# Altium schematic symbol library GN-1846-E-V2_Library.SchLib: 99 symbols (part 6 of 7)
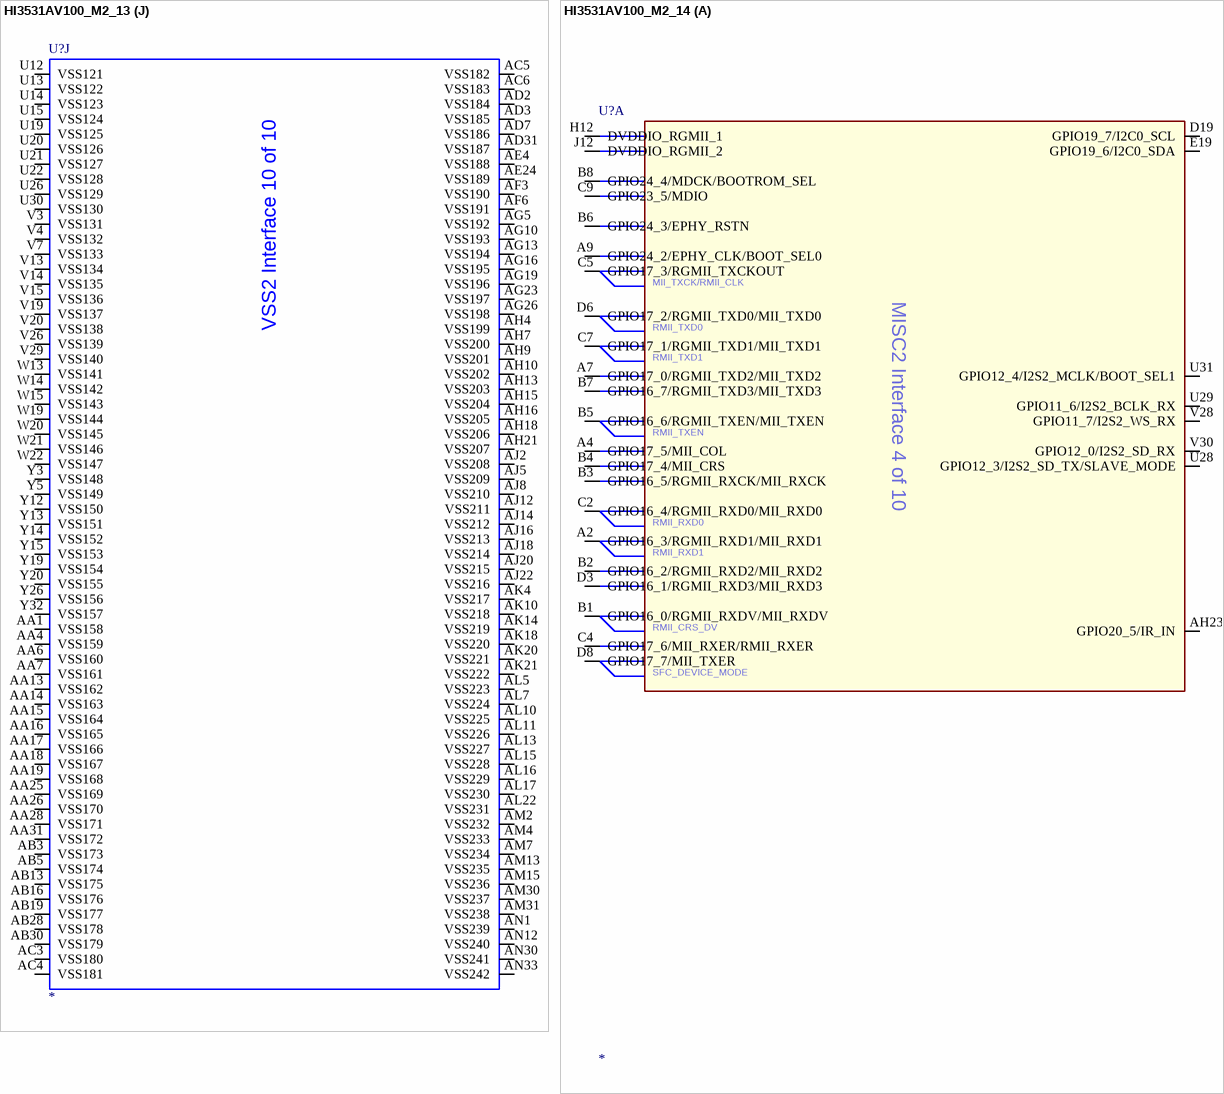
[diagram p82: symbols HI3531AV100_M2_13 to HI3531AV100_M2_14]

## HI3531AV100_M2_13
designator U?
FORWARD_PCB: 1; HETERO: (HI3531AV100_DDR1),(HI3531AV100_DDR2),(HI3531AV100_SYSTEM),(HI3531AV100_AD),(HI3531AV100_VO),(HI3531AV100_M1),(HI3531AV100_M2),(HI3531AV100_POWER),(HI3531AV100_VSS1),(HI3531AV100_VSS2); DEVICE: HI3531AV100; LEVEL: STD; OriginalSymbolOrigin: (30,630); PARTS: 1
part A pins: A2 GPIO16_3/RGMII_RXD1/MII_RXD1, A4 GPIO17_5/MII_COL, A7 GPIO17_0/RGMII_TXD2/MII_TXD2, A9 GPIO24_2/EPHY_CLK/BOOT_SEL0, AH23 GPIO20_5/IR_IN, B1 GPIO16_0/RGMII_RXDV/MII_RXDV, B2 GPIO16_2/RGMII_RXD2/MII_RXD2, B3 GPIO16_5/RGMII_RXCK/MII_RXCK, B4 GPIO17_4/MII_CRS, B5 GPIO16_6/RGMII_TXEN/MII_TXEN, B6 GPIO24_3/EPHY_RSTN, B7 GPIO16_7/RGMII_TXD3/MII_TXD3, B8 GPIO24_4/MDCK/BOOTROM_SEL, C2 GPIO16_4/RGMII_RXD0/MII_RXD0, C4 GPIO17_6/MII_RXER/RMII_RXER, C5 GPIO17_3/RGMII_TXCKOUT, C7 GPIO17_1/RGMII_TXD1/MII_TXD1, C9 GPIO23_5/MDIO, D3 GPIO16_1/RGMII_RXD3/MII_RXD3, D6 GPIO17_2/RGMII_TXD0/MII_TXD0, D8 GPIO17_7/MII_TXER, D19 GPIO19_7/I2C0_SCL, E19 GPIO19_6/I2C0_SDA, H12 DVDDIO_RGMII_1, J12 DVDDIO_RGMII_2, U28 GPIO12_3/I2S2_SD_TX/SLAVE_MODE, U29 GPIO11_6/I2S2_BCLK_RX, U31 GPIO12_4/I2S2_MCLK/BOOT_SEL1, V28 GPIO11_7/I2S2_WS_RX, V30 GPIO12_0/I2S2_SD_RX
part B pins: A13 HDMI_TX1P, A15 HDMI_TXCP, A16 AVSS_HDMITX1, A17 VGA_G, A18 VGA_B, A21 GPIO10_4/VOU1120_DAT12, A22 GPIO10_2/VOU1120_DAT10, AJ24 GPIO23_7/UART3_TXD, AK25 GPIO23_6/UART3_RXD, B13 HDMI_TX1N, B15 HDMI_TXCN, B16 AVSS_HDMITX2, B17 VGA_R, B18 AVSS_VDAC1, B20 GPIO10_7/VOU1120_DAT15, B21 GPIO10_5/VOU1120_DAT13, B22 GPIO10_1/VOU1120_DAT9, B23 GPIO10_0/VOU1120_DAT8, C12 HDMI_TX2P, C13 AVSS_HDMITX3, C14 HDMI_TX0P, C15 AVSS_HDMITX4, C16 GPIO14_4/HDMI_HOTPLUG, C18 CVBS_OUT, C19 AVSS_VDAC2, C20 GPIO10_6/VOU1120_DAT14, C21 GPIO10_3/VOU1120_DAT11, C23 GPIO20_7/VOU1120_CLK, D12 HDMI_TX2N, D13 AVSS_HDMITX5, D14 HDMI_TX0N, D15 AVSS_HDMITX6, D16 GPIO14_6/HDMI_SDA, D17 GPIO24_0/VGA_HS, D18 AVSS_VDAC3, D20 GPIO9_7/VOU1120_DAT7/UART1_TXD, D22 GPIO9_1/VOU1120_DAT1/UART0_TXD, D23 GPIO9_0/VOU1120_DAT0/UART0_RXD, D24 GPIO12_7/I2S3_SD_TX, E2 GPIO0_1/VOU_SLV_DAT1, E3 GPIO0_6/VOU_SLV_CLK, E12 AVSS_HDMITX7, E13 AVSS_HDMITX8, E14 AVSS_HDMITX9, E15 GPIO14_5/HDMI_CEC, E16 GPIO14_7/HDMI_SCL, E17 GPIO24_1/VGA_VS, E18 AVSS_VDAC4, E20 GPIO9_6/VOU1120_DAT6/UART1_RXD, E21 GPIO9_5/VOU1120_DAT5/UART1_CTSN, E22 GPIO9_2/VOU1120_DAT2/UART2_RXD, E23 GPIO9_3/VOU1120_DAT3/UART2_TXD, E24 GPIO12_6/I2S3_WS_TX, F1 GPIO13_7/VOU_SLV_DAT3, F2 UART0_TXD/VOU_SLV_DAT4/GPIO18_1, F3 GPIO0_7/VOU_SLV_DAT2, F18 VDAC_REXT, F22 GPIO9_4/VOU1120_DAT4/UART1_RTSN, F24 GPIO12_5/I2S3_BCLK_TX, G1 UART0_RXD/VOU_SLV_DAT5/GPIO18_0, G2 GPIO18_5/VOU_SLV_DAT6/UART1_TXD, G3 GPIO0_2/VOU_SLV_DAT0, H2 GPIO18_4/VOU_SLV_DAT7/UART1_RXD, H3 GPIO0_3/VOU_SLV_DAT9, H15 AVSS_HDMITX10, H16 AVSS_HDMITX11, H18 AVSS_VDAC5, H19 AVSS_VDAC6, H20 DVSS_VDAC, J1 GPIO18_7/VOU_SLV_DAT13, J2 GPIO18_6/VOU_SLV_DAT12, J3 GPIO18_3/VOU_SLV_DAT10, J15 AVDD33_HDMITX, J16 AVCC11_HDMITX, J18 AVSS_VDAC_0, J19 AVDD33_VDAC, J20 DVDD33_VDAC, K1 GPIO0_0/VOU_SLV_DAT15, K2 GPIO0_4/VOU_SLV_DAT14, K3 GPIO18_2/VOU_SLV_DAT11, L3 GPIO0_5/VOU_SLV_DAT8
part C pins: A24 VI0_DAT0/GPIO1_0, A25 VI0_DAT2/GPIO1_2, A27 VI1_DAT2/GPIO2_2, A28 VI2_CLK/GPIO21_3/VI_ADC_REFCLK1, A29 VI2_DAT1/GPIO3_1, A30 VI2_DAT3/GPIO3_3, A31 VI2_DAT5/GPIO3_5, A32 VI3_CLK/GPIO21_4/VI2_CLK, B24 VI0_CLK/GPIO21_0/VI_ADC_REFCLK0, B25 VI0_DAT3/GPIO1_3, B26 VI1_CLK/GPIO21_1/VI0_CLK, B27 VI1_DAT1/GPIO2_1, B29 VI2_DAT0/GPIO3_0, B30 VI2_DAT4/GPIO3_4, B31 VI2_DAT6/GPIO3_6, B32 VI3_DAT1/GPIO4_1, B33 VI3_DAT2/GPIO4_2, C25 VI0_DAT1/GPIO1_1, C27 VI1_DAT0/GPIO2_0, C28 GPIO21_2/VI_ADC_REFCLK0/VI1_CLK, C30 VI2_DAT2/GPIO3_2, C31 VI3_DAT0/GPIO4_0, C32 VI3_DAT3/GPIO4_3, C33 VI3_DAT4/GPIO4_4, D25 VI0_DAT4/GPIO1_4, D27 VI1_DAT4/GPIO2_4, D28 VI1_DAT6/GPIO2_6, D29 VI2_DAT7/GPIO3_7, D30 GPIO11_1/I2S0_WS_RX, D31 VI3_DAT5/GPIO4_5, D32 VI3_DAT6/GPIO4_6, E25 VI0_DAT5/GPIO1_5, E26 VI0_DAT6/GPIO1_6, E27 VI1_DAT3/GPIO2_3, E28 VI1_DAT7/GPIO2_7, E29 GPIO11_2/I2S0_SD_RX, E31 VI3_DAT7/GPIO4_7, E32 GPIO21_5/VI_ADC_REFCLK1/VI3_CLK, F26 VI0_DAT7/GPIO1_7, F27 VI1_DAT5/GPIO2_5, F28 GPIO11_0/I2S0_BCLK_RX, F29 VI4_DAT1/GPIO5_1, F30 VI4_DAT0/GPIO5_0, F31 VI4_CLK/GPIO21_6/VI_ADC_REFCLK2, F32 VI4_DAT5/GPIO5_5, F33 VI4_DAT4/GPIO5_4, G28 VI4_DAT2/GPIO5_2, G29 VI4_DAT3/GPIO5_3, G30 VI5_DAT0/GPIO6_0, G32 VI4_DAT6/GPIO5_6, H29 VI5_DAT1/GPIO6_1, H30 VI5_DAT2/GPIO6_2, H31 VI4_DAT7/GPIO5_7, H32 VI5_CLK/GPIO21_7/VI4_CLK, J28 VI5_DAT3/GPIO6_3, J29 VI5_DAT4/GPIO6_4, J30 VI5_DAT5/GPIO6_5, J31 GPIO12_1/VI_ADC_REFCLK2/VI5_CLK, J32 VI5_DAT7/GPIO6_7, J33 VI5_DAT6/GPIO6_6, K25 DVDD3318_VI_1, K28 GPIO11_3/I2S1_BCLK_RX, K29 GPIO11_4/I2S1_WS_RX, K32 VI6_CLK/GPIO12_2/VI_ADC_REFCLK3, L25 DVDD3318_VI_2, L29 GPIO11_5/I2S1_SD_RX, L30 VI6_DAT0/GPIO7_0, L31 VI6_DAT4/GPIO7_4, L32 VI6_DAT6/GPIO7_6, L33 VI6_DAT5/GPIO7_5, M25 DVDD3318_VI_3, M28 VI6_DAT1/GPIO7_1, M29 VI6_DAT2/GPIO7_2, M32 VI7_CLK/GPIO15_7/VI6_CLK, M33 VI6_DAT7/GPIO7_7, N25 DVDD3318_VI_4, N28 VI6_DAT3/GPIO7_3, N29 VI7_DAT0/GPIO8_0, N30 VI7_DAT1/GPIO8_1, N31 VI7_DAT5/GPIO8_5, N32 VI7_DAT6/GPIO8_6, P25 DVDD3318_VI_5, P28 VI7_DAT4/GPIO8_4, P29 VI7_DAT2/GPIO8_2, P30 VI7_DAT3/GPIO8_3, P31 VI7_DAT7/GPIO8_7, P33 GPIO20_6/VI_ADC_REFCLK3/VI7_CLK, R25 DVDD3318_VI_6, R29 SPI_CSN0/PCIE_SATA_MODE0, R31 GPIO13_0/SPI_SCLK/I2C1_SCL, R32 GPIO13_2/SPI_SDI, R33 TEST_CLK/SPI_SDO/I2C1_SDA, T28 SPI_CSN3/PCIE_SATA_MODE3, T29 SPI_CSN1/PCIE_SATA_MODE1, T30 SPI_CSN2/PCIE_SATA_MODE2
part D pins: A10 GPIO14_0/USB2_OVRCUR, A11 USB2_DP, AA20 AVSS_SATA0_1, AA21 AVSS_SATA2_1, AA22 AVDD_SATA2, AB20 AVDD_SATA0, AB21 AVDD_SATA1, AB22 AVSS_SATA1_1, AC25 AVDD33_SATA3, AC26 AVSS_SATA3_2, AD22 AVDD33_SATA0, AD23 AVDD33_SATA1, AD25 AVDD33_SATA2, AD26 AVSS_SATA2_2, AE22 AVSS_SATA0_2, AE23 AVSS_SATA1_2, AE29 AVSS_SATA3_3, AE30 AVSS_SATA3_4, AF28 AVSS_SATA3_5, AF29 SATA_TX3P/PCIE0_TX0P, AF30 SATA_TX3M/PCIE0_TX0M, AF31 AVSS_SATA3_6, AF32 SATA_RX3P/PCIE0_RX0P, AF33 SATA_RX3M/PCIE0_RX0M, AG24 AVDD33_USB3, AG25 AVSS_USB3_1, AG28 AVSS_SATA2_3, AG29 AVSS_SATA2_4, AG30 AVSS_SATA2_5, AH25 USB3_REXT, AH26 GPIO14_3/USB3_PWREN, AH27 GPIO14_2/USB3_OVRCUR, AH28 AVSS_SATA1_3, AH29 SATA_TX2P/PCIE1_TX0P/PCIE0_TX1P, AH30 SATA_TX2M/PCIE1_TX0M/PCIE0_TX1M, AH31 AVSS_SATA2_6, AH32 SATA_RX2P/PCIE1_RX0P/PCIE0_RX1P, AH33 SATA_RX2M/PCIE1_RX0M/PCIE0_RX1M, AJ25 AVSS_SATA0_3, AJ26 SATA_TX0P/PCIE1_TX1P/USB3_TXP, AJ27 AVSS_SATA0_4, AJ28 SATA_TX1P/PCIE1_TX0P, AJ29 AVSS_SATA1_4, AJ30 AVSS_SATA2_7, AK26 SATA_TX0M/PCIE1_TX1M/USB3_TXM, AK27 AVSS_SATA0_5, AK28 SATA_TX1M/PCIE1_TX0M, AK29 AVSS_SATA1_5, AK30 AVSS_SATA2_8, AK31 AVSS_SATA2_9, AK32 PCIE_REFCLK0P, AK33 PCIE_REFCLK0M, AL24 AVSS_USB3_2, AL26 AVSS_SATA0_6, AL28 AVSS_SATA1_6, AL30 PCIE_REFCLK1P, AL31 PCIE_REFCLK1M, AM24 USB3_DP, AM26 SATA_RX0P/PCIE1_RX1P/USB3_RXP, AM28 SATA_RX1P/PCIE1_RX0P, AM32 GPIO15_2/SATA_LED_N2, AM33 GPIO15_3/SATA_LED_N3, AN24 USB3_DM, AN26 SATA_RX0M/PCIE1_RX1M/USB3_RXM, AN28 SATA_RX1M/PCIE1_RX0M, AN31 GPIO15_0/SATA_LED_N0, AN32 GPIO15_1/SATA_LED_N1, B10 GPIO14_1/USB2_PWREN, B11 USB2_DM, C11 AVSS_USB2_1, D10 AVSS_USB2_2, D11 USB2_REXT, H14 AVSS_USB2_3, J14 AVDD33_USB2, Y21 AVSS_SATA3_1, Y22 AVDD_SATA3
part E pins: AA29 RSTN, AA30 NF_DQ0/VI8_DAT14/GPIO22_0, AA32 XIN, AA33 XOUT, AB25 AVDD33_RTC, AB26 AVSS_RTC1, AB29 WDG_RSTN/SYS_RSTN_OUT, AB31 RTC_XIN, AB32 RTC_XOUT, AC28 SFC_HOLD_IO3/GPIO19_3, AC29 SFC_DOI/GPIO19_2, AC30 SFC_WP_IO2/GPIO19_1, AC31 AVSS_RTC2, AC32 AVSS_RTC3, AD28 AVSS_RTC4, AD29 SFC_CLK/GPIO24_5/SFC_BOOT_MODE, AD30 SFC_DIO/GPIO19_0, AD32 SFC_CS1N/GPIO19_5, AD33 SFC_CS0N/GPIO19_4, AE28 AVDD_BAT, AG27 AVDD_EFUSE, AH22 TEST_MODE, AH24 POR_ENABLE, AJ23 JTAG_TRSTN/GPIO20_0, AK22 JTAG_EN, AK23 JTAG_TCK/GPIO20_1, AK24 JTAG_TDI/GPIO20_4, AL23 JTAG_TMS/GPIO20_2, AM23 JTAG_TDO/GPIO20_3, C1 PWM_OUT0/GPIO15_4, D1 PWM_OUT2/GPIO15_6, D2 PWM_OUT1/GPIO15_5, T32 NF_RDY1/VI8_CLK/GPIO23_2, U32 NF_RDY0/VI8_DAT1/GPIO23_1, U33 NF_REN/VI8_DAT2/GPIO13_5, V31 NF_CLE/VI8_DAT5/GPIO13_3, V32 NF_CSN0/VI8_DAT3/GPIO23_3, V33 NF_CSN1/VI8_DAT4/GPIO23_4, W28 NF_DQ7/VI8_DAT7/GPIO22_7, W29 NF_DQ5/VI8_DAT9/GPIO22_5, W30 NF_DQ4/VI8_DAT10/GPIO22_4, W31 NF_DQ6/VI8_DAT8/GPIO22_6, W32 NF_WEN/VI8_DAT0/GPIO13_6, W33 NF_ALE/VI8_DAT6/GPIO13_4, Y25 DVDDIO_SFC, Y28 NF_DQ1/VI8_DAT13/GPIO22_1, Y29 NF_DQ3/VI8_DAT11/GPIO22_3, Y30 NF_DQ2/VI8_DAT12/GPIO22_2, Y31 GPIO23_0/VI8_DAT15
part F pins: AB14 AVDD_DDRPLL3, AB15 AVSS_DDRPLL3, AB17 AVDD_DDRPLL4, AB18 AVSS_DDRPLL4, AG8 VDDIO_DDR11, AG9 VDDIO_DDR12, AG11 VDDIO_DDR13, AG12 VDDIO_DDR14, AG14 VDDIO_DDR15, AG15 VDDIO_CK_DDR1, AG17 VDDIO_DDR16, AG18 VDDIO_DDR17, AG20 VDDIO_DDR18, AG21 DDR1_ZQ, AH5 VDDIO_DDR19, AH6 VDDIO_DDR20, AH8 DDR1_DM0, AH11 DDR1_DQ25, AH12 DDR1_DQ17, AH14 DDR1_DQ24, AH17 DDR1_A0, AH19 DDR1_A4, AH20 DDR1_A8, AJ6 DDR1_DQ6, AJ7 DDR1_DQ7, AJ9 DDR1_DQ10, AJ10 DDR1_DQ20, AJ11 DDR1_DQ16, AJ13 DDR1_DQ19, AJ15 DDR1_WE_N, AJ17 DDR1_A12, AJ19 DDR1_A6, AJ21 DDR1_A14, AK5 DDR1_DQ2, AK6 DDR1_DQ4, AK7 DDR1_DQ1, AK8 DDR1_DQ8, AK9 DDR1_DQ14, AK11 DDR1_DM3, AK12 DDR1_DQ23, AK13 DDR1_DM2, AK15 DDR1_CAS_N, AK16 DDR1_A10, AK17 DDR1_A15, AK19 DDR1_A1, AL3 DDR1_DQ13, AL4 DDR1_DQ0, AL6 DDR1_DQS1_N, AL8 DDR1_DQ22, AL9 DDR1_DQ29, AL12 DDR1_DQS3_N, AL14 DDR1_DQ30, AL18 DDR1_ODT, AL19 DDR1_A11, AL20 DDR1_A5, AL21 DDR1_A7, AM3 DDR1_DQ9, AM5 DDR1_DQS0_N, AM6 DDR1_DQS1_P, AM8 DDR1_DQ3, AM9 DDR1_DQ18, AM10 DDR1_DQ31, AM11 DDR1_DQS2_N, AM12 DDR1_DQS3_P, AM14 DDR1_DQ26, AM16 DDR1_CLK_P, AM17 DDR1_CKE, AM18 DDR1_RAS_N, AM19 DDR1_A3, AM20 DDR1_A2, AM21 DDR1_RESET_N, AM22 DDR1_A13, AN2 DDR1_DQ11, AN3 DDR1_DQ15, AN4 DDR1_DM1, AN5 DDR1_DQS0_P, AN7 DDR1_DQ12, AN8 DDR1_DQ5, AN10 DDR1_DQ27, AN11 DDR1_DQS2_P, AN14 DDR1_DQ28, AN15 DDR1_DQ21, AN16 DDR1_CLK_N, AN17 DDR1_BA1, AN18 DDR1_CS_N, AN19 DDR1_BA2, AN21 DDR1_A9, AN22 DDR1_BA0
part G pins: AA2 DDR0_DQS3_P, AA3 DDR0_DQS3_N, AA5 DDR0_DM2, AA12 AVDD_DDRPLL2, AB2 DDR0_DQ26, AB4 DDR0_DQ24, AB6 DDR0_DQ19, AB7 VDDIO_DDR5, AB12 AVSS_DDRPLL2, AC1 DDR0_DQ28, AC2 DDR0_DQ30, AC7 VDDIO_DDR6, AD1 DDR0_DQ21, AD4 DDR0_WE_N, AD5 DDR0_CAS_N, AD6 DDR0_A10, AE1 DDR0_CLK_N, AE2 DDR0_CLK_P, AE3 DDR0_A0, AE5 DDR0_A12, AE6 DDR0_A15, AE7 VDDIO_DDR7, AF1 DDR0_BA1, AF2 DDR0_CKE, AF4 DDR0_A4, AF5 DDR0_A6, AF7 VDDIO_DDR8, AG1 DDR0_CS_N, AG2 DDR0_RAS_N, AG3 DDR0_A1, AG4 DDR0_A11, AG6 VDDIO_DDR9, AG7 VDDIO_DDR10, AH1 DDR0_BA2, AH2 DDR0_ODT, AH3 DDR0_A3, AJ1 DDR0_A5, AJ3 DDR0_A8, AJ4 DDR0_A14, AK1 DDR0_A7, AK2 DDR0_A2, AK3 DDR0_A9, AL1 DDR0_RESET_N, AL2 DDR0_BA0, AM1 DDR0_A13, M1 DDR0_DQ13, M2 DDR0_DQ15, M5 DDR0_DQ0, M6 DDR0_DQ11, N1 DDR0_DQ9, N3 DDR0_DM1, N4 DDR0_DQ6, N5 DDR0_DQ2, N7 DDR0_ZQ, P1 DDR0_DQS0_P, P2 DDR0_DQS0_N, P4 DDR0_DQ7, P6 DDR0_DQ4, P7 VDDIO_DDR1, R2 DDR0_DQS1_P, R3 DDR0_DQS1_N, R4 DDR0_DM0, R5 DDR0_DQ1, T2 DDR0_DQ12, T5 DDR0_DQ8, T7 VDDIO_DDR2, U1 DDR0_DQ14, U3 DDR0_DQ5, U4 DDR0_DQ10, U6 DDR0_DQ3, U7 VDDIO_DDR3, V1 DDR0_DQ22, V2 DDR0_DQ18, V5 DDR0_DQ25, V6 DDR0_DQ20, V12 AVDD_DDRPLL1, W2 DDR0_DQ27, W3 DDR0_DQ29, W4 DDR0_DQ31, W5 DDR0_DQ16, W6 DDR0_DM3, W7 VDDIO_CK_DDR0, W12 AVSS_DDRPLL1, Y1 DDR0_DQS2_P, Y2 DDR0_DQS2_N, Y4 DDR0_DQ17, Y6 DDR0_DQ23, Y7 VDDIO_DDR4
part H pins: AD24 DVDD33_9, AG22 DVDD33_10, E7 DVDD33_1, F5 DVDD_CPU1, F6 DVDD_CPU2, G5 DVDD_CPU3, G6 DVDD_CPU4, G7 DVDD_CPU5, H5 DVDD_CPU6, H6 DVDD_CPU7, H7 DVDD_CPU8, J5 DVDD_CPU9, J6 DVDD_CPU10, J7 DVDD_CPU11, J13 DVDD33_2, J17 DVDD33_3, J21 DVDD33_4, J22 DVDD33_5, L7 DVDD33_6, M12 DVDD_CPU12, M13 DVDD_CPU13, M16 DVDD_CORE1, M17 DVDD_CORE2, M18 DVDD_CORE3, N12 DVDD_CPU14, N13 DVDD_CPU15, N16 DVDD_CORE4, N17 DVDD_CORE5, N18 DVDD_CORE6, P16 DVDD_CORE7, P17 DVDD_CORE8, P18 DVDD_CORE9, R16 DVDD_CORE10, R17 DVDD_CORE11, R18 DVDD_CORE12, T16 DVDD_CORE13, T17 DVDD_CORE14, T18 DVDD_CORE15, U16 DVDD_CORE16, U17 DVDD_CORE17, U18 DVDD_CORE18, U25 DVDD33_7, V16 DVDD_CORE19, V17 DVDD_CORE20, V18 DVDD_CORE21, V21 AVSS_PLL1, V22 AVDD11_PLL, V25 DVDD33_8, W16 DVDD_CORE22, W17 DVDD_CORE23, W18 DVDD_CORE24, W25 AVDD33_PLL, W26 AVSS_PLL2, Y16 DVDD_CORE25, Y17 DVDD_CORE26, Y18 DVDD_CORE27
part I pins: A1 VSS1, A33 VSS2, B9 VSS3, B19 VSS4, B28 VSS5, C3 VSS6, C6 VSS7, C8 VSS8, C10 VSS9, C17 VSS10, C22 VSS11, C24 VSS12, C26 VSS13, C29 VSS14, D4 VSS15, D5 VSS16, D7 VSS17, D9 VSS18, D21 VSS19, D26 VSS20, E4 VSS21, E5 VSS22, E6 VSS23, E30 VSS24, E33 VSS25, F4 VSS26, F7 VSS27, F19 VSS28, F20 VSS29, F21 VSS30, F23 VSS31, F25 VSS32, G4 VSS33, G31 VSS34, H4 VSS35, H11 VSS36, H13 VSS37, H17 VSS38, H21 VSS39, H22 VSS40, H28 VSS41, H33 VSS42, J4 VSS43, J11 VSS44, K4 VSS45, K5 VSS46, K6 VSS47, K7 VSS48, K26 VSS49, K30 VSS50, K31 VSS51, L2 VSS52, L4 VSS53, L5 VSS54, L6 VSS55, L26 VSS56, L28 VSS57, M3 VSS58, M4 VSS59, M7 VSS60, M14 VSS61, M15 VSS62, M19 VSS63, M20 VSS64, M21 VSS65, M22 VSS66, M26 VSS67, M30 VSS68, M31 VSS69, N2 VSS70, N6 VSS71, N14 VSS72, N15 VSS73, N19 VSS74, N20 VSS75, N21 VSS76, N22 VSS77, N26 VSS78, P3 VSS79, P5 VSS80, P12 VSS81, P13 VSS82, P14 VSS83, P15 VSS84, P19 VSS85, P20 VSS86, P21 VSS87, P22 VSS88, P26 VSS89, P32 VSS90, R1 VSS91, R6 VSS92, R7 VSS93, R12 VSS94, R13 VSS95, R14 VSS96, R15 VSS97, R19 VSS98, R20 VSS99, R21 VSS100, R22 VSS101, R26 VSS102, R28 VSS103, R30 VSS104, T3 VSS105, T4 VSS106, T6 VSS107, T12 VSS108, T13 VSS109, T14 VSS110, T15 VSS111, T19 VSS112, T20 VSS113, T21 VSS114, T22 VSS115, T25 VSS116, T26 VSS117, T31 VSS118, U2 VSS119, U5 VSS120
part J pins: AA1 VSS158, AA4 VSS159, AA6 VSS160, AA7 VSS161, AA13 VSS162, AA14 VSS163, AA15 VSS164, AA16 VSS165, AA17 VSS166, AA18 VSS167, AA19 VSS168, AA25 VSS169, AA26 VSS170, AA28 VSS171, AA31 VSS172, AB3 VSS173, AB5 VSS174, AB13 VSS175, AB16 VSS176, AB19 VSS177, AB28 VSS178, AB30 VSS179, AC3 VSS180, AC4 VSS181, AC5 VSS182, AC6 VSS183, AD2 VSS184, AD3 VSS185, AD7 VSS186, AD31 VSS187, AE4 VSS188, AE24 VSS189, AF3 VSS190, AF6 VSS191, AG5 VSS192, AG10 VSS193, AG13 VSS194, AG16 VSS195, AG19 VSS196, AG23 VSS197, AG26 VSS198, AH4 VSS199, AH7 VSS200, AH9 VSS201, AH10 VSS202, AH13 VSS203, AH15 VSS204, AH16 VSS205, AH18 VSS206, AH21 VSS207, AJ2 VSS208, AJ5 VSS209, AJ8 VSS210, AJ12 VSS211, AJ14 VSS212, AJ16 VSS213, AJ18 VSS214, AJ20 VSS215, AJ22 VSS216, AK4 VSS217, AK10 VSS218, AK14 VSS219, AK18 VSS220, AK20 VSS221, AK21 VSS222, AL5 VSS223, AL7 VSS224, AL10 VSS225, AL11 VSS226, AL13 VSS227, AL15 VSS228, AL16 VSS229, AL17 VSS230, AL22 VSS231, AM2 VSS232, AM4 VSS233, AM7 VSS234, AM13 VSS235, AM15 VSS236, AM30 VSS237, AM31 VSS238, AN1 VSS239, AN12 VSS240, AN30 VSS241, AN33 VSS242, U12 VSS121, U13 VSS122, U14 VSS123, U15 VSS124, U19 VSS125, U20 VSS126, U21 VSS127, U22 VSS128, U26 VSS129, U30 VSS130, V3 VSS131, V4 VSS132, V7 VSS133, V13 VSS134, V14 VSS135, V15 VSS136, V19 VSS137, V20 VSS138, V26 VSS139, V29 VSS140, W13 VSS141, W14 VSS142, W15 VSS143, W19 VSS144, W20 VSS145, W21 VSS146, W22 VSS147, Y3 VSS148, Y5 VSS149, Y12 VSS150, Y13 VSS151, Y14 VSS152, Y15 VSS153, Y19 VSS154, Y20 VSS155, Y26 VSS156, Y32 VSS157

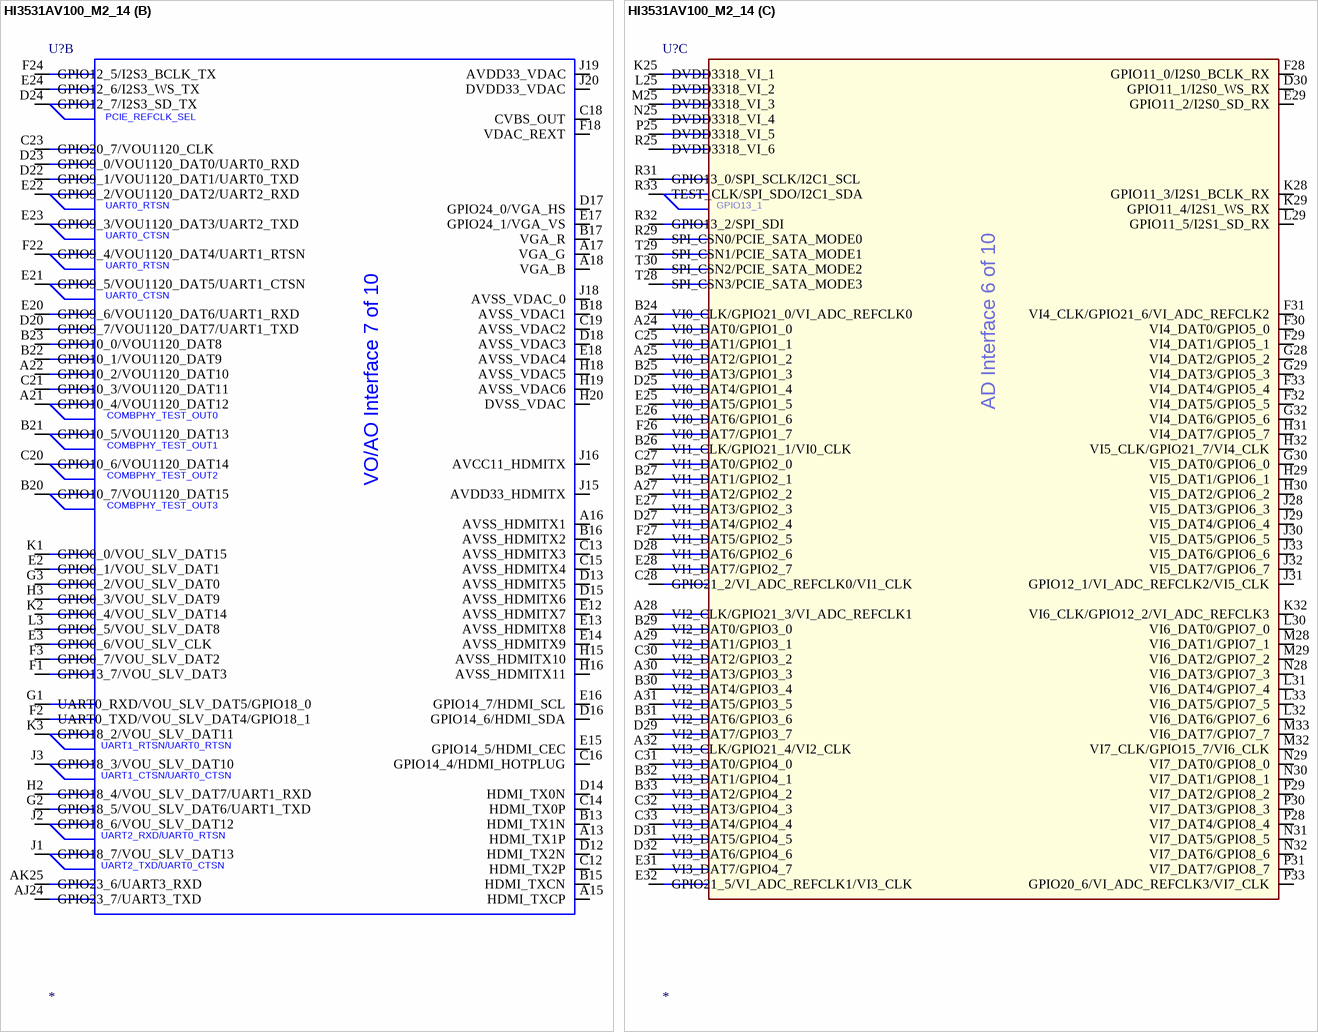
[diagram p61: symbol HI3531AV100_M2_14]

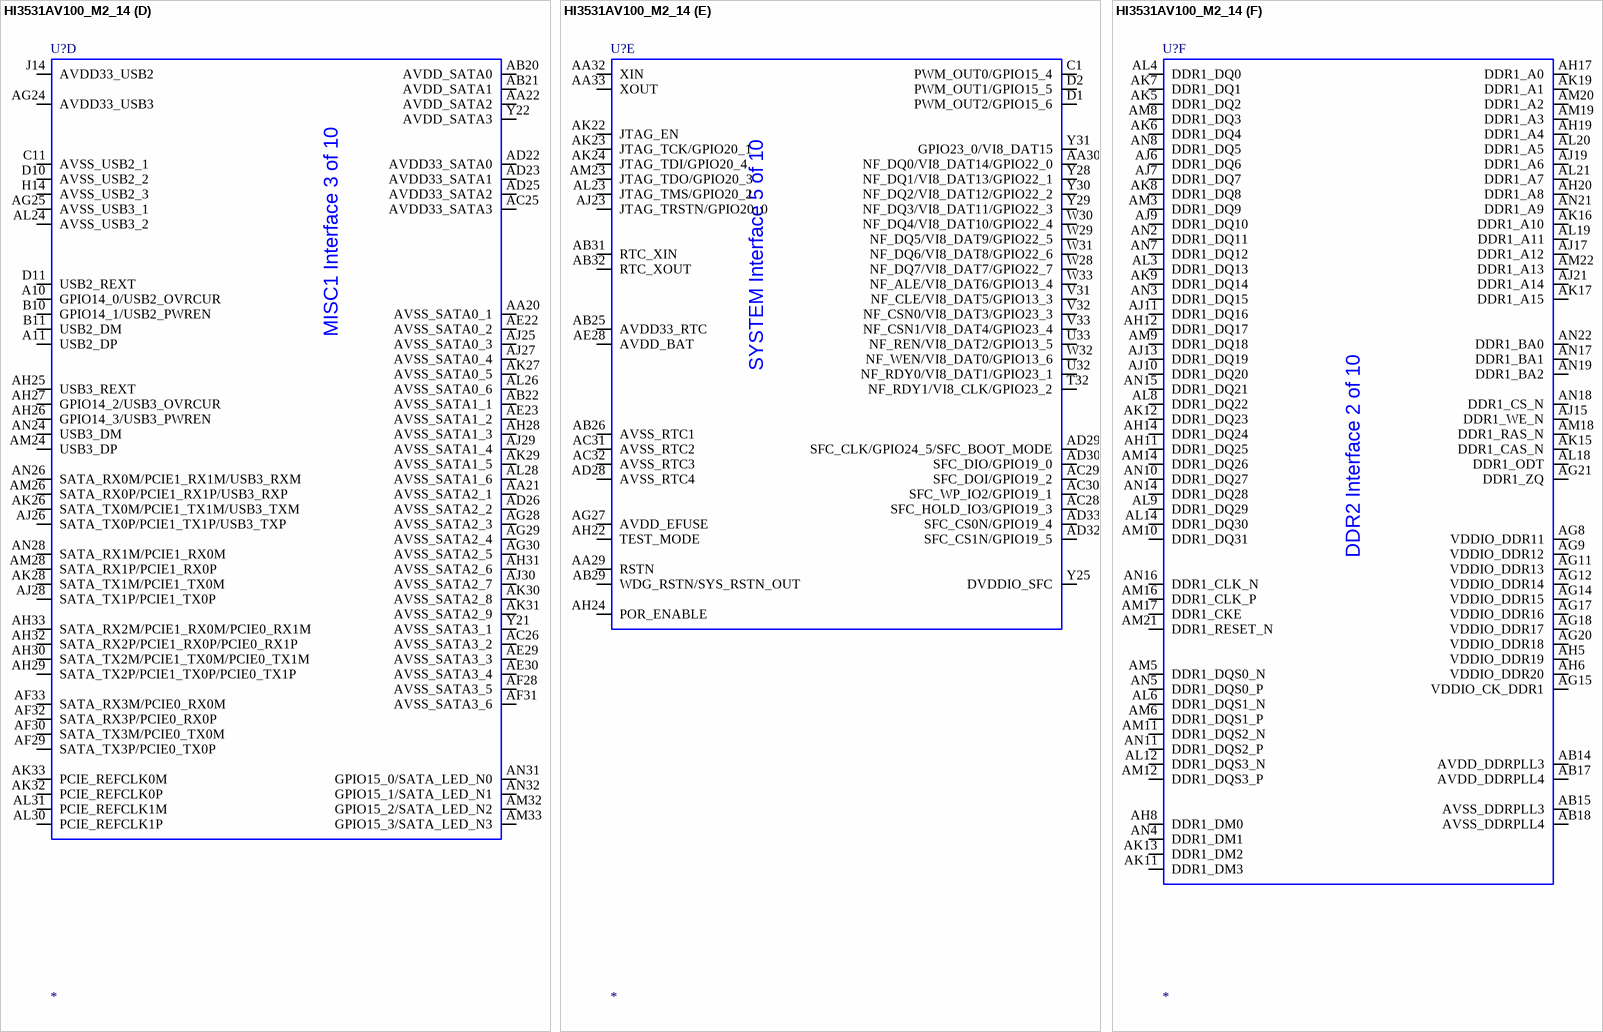
[diagram p62: symbol HI3531AV100_M2_14]

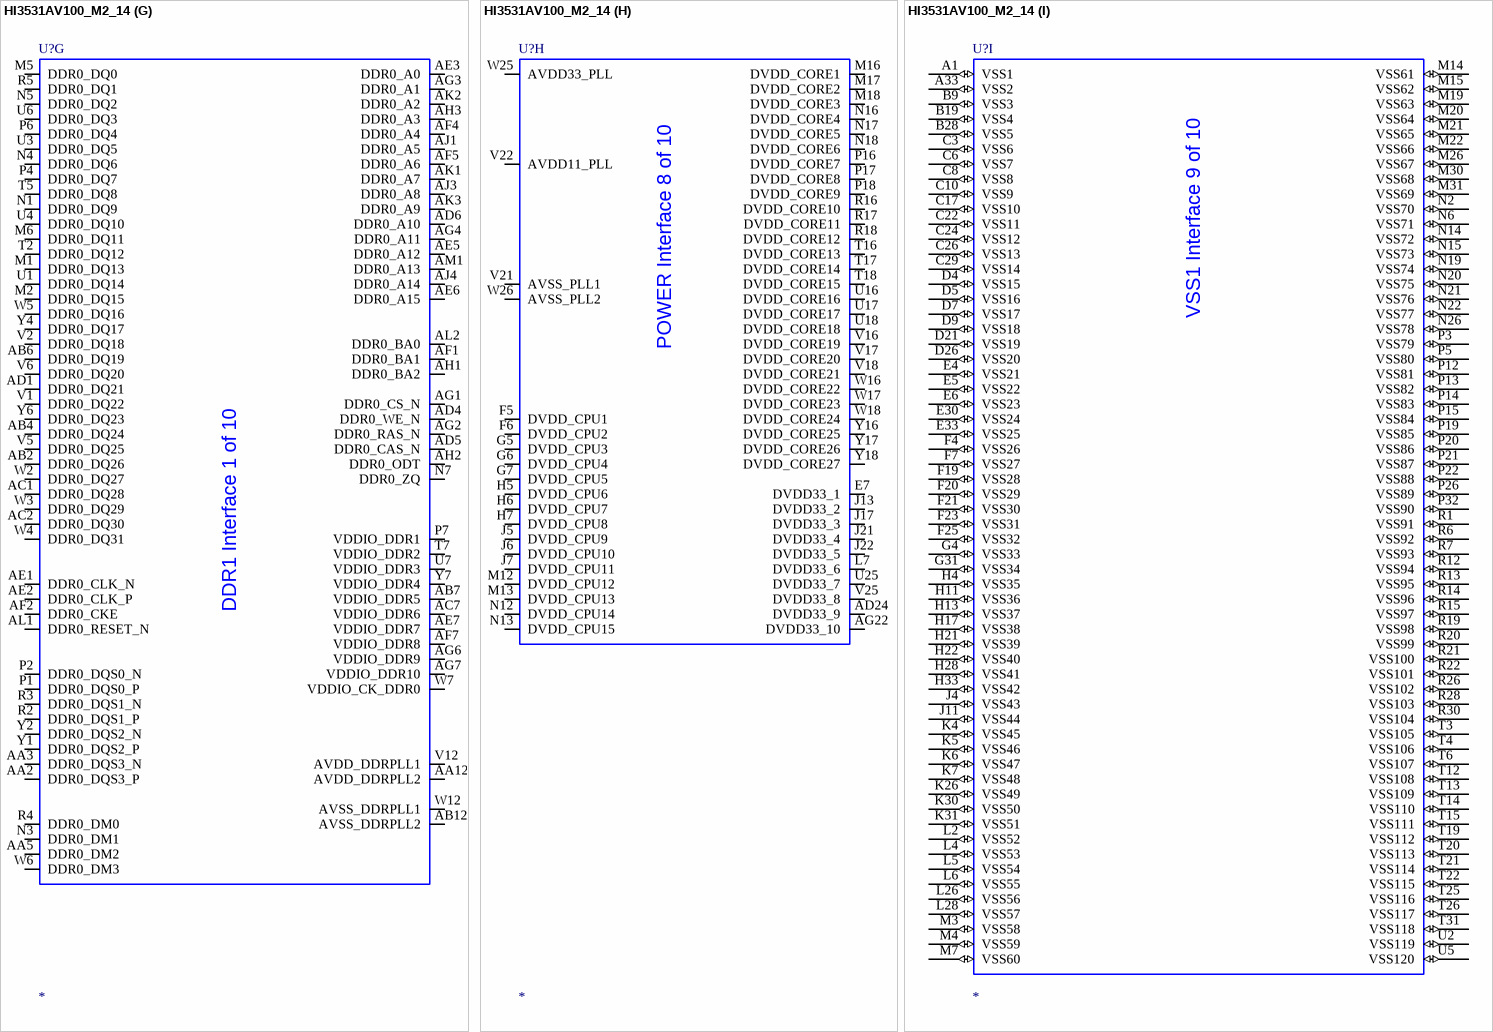
[diagram p63: symbol HI3531AV100_M2_14]
